# Altium footprint library Maxwell_LIB.PcbLib: 143 footprints (part 6 of 9)
Each footprint in its own frame and in the unit in brackets; x right, y up, seen from the top. Pads: shape width x height; smd on the part's side, far side on the other; paste and mask are expansions set on the pad; w line width, h text height; cw(c..) or ccw(c..) is an arc to the next point about the centre after c.
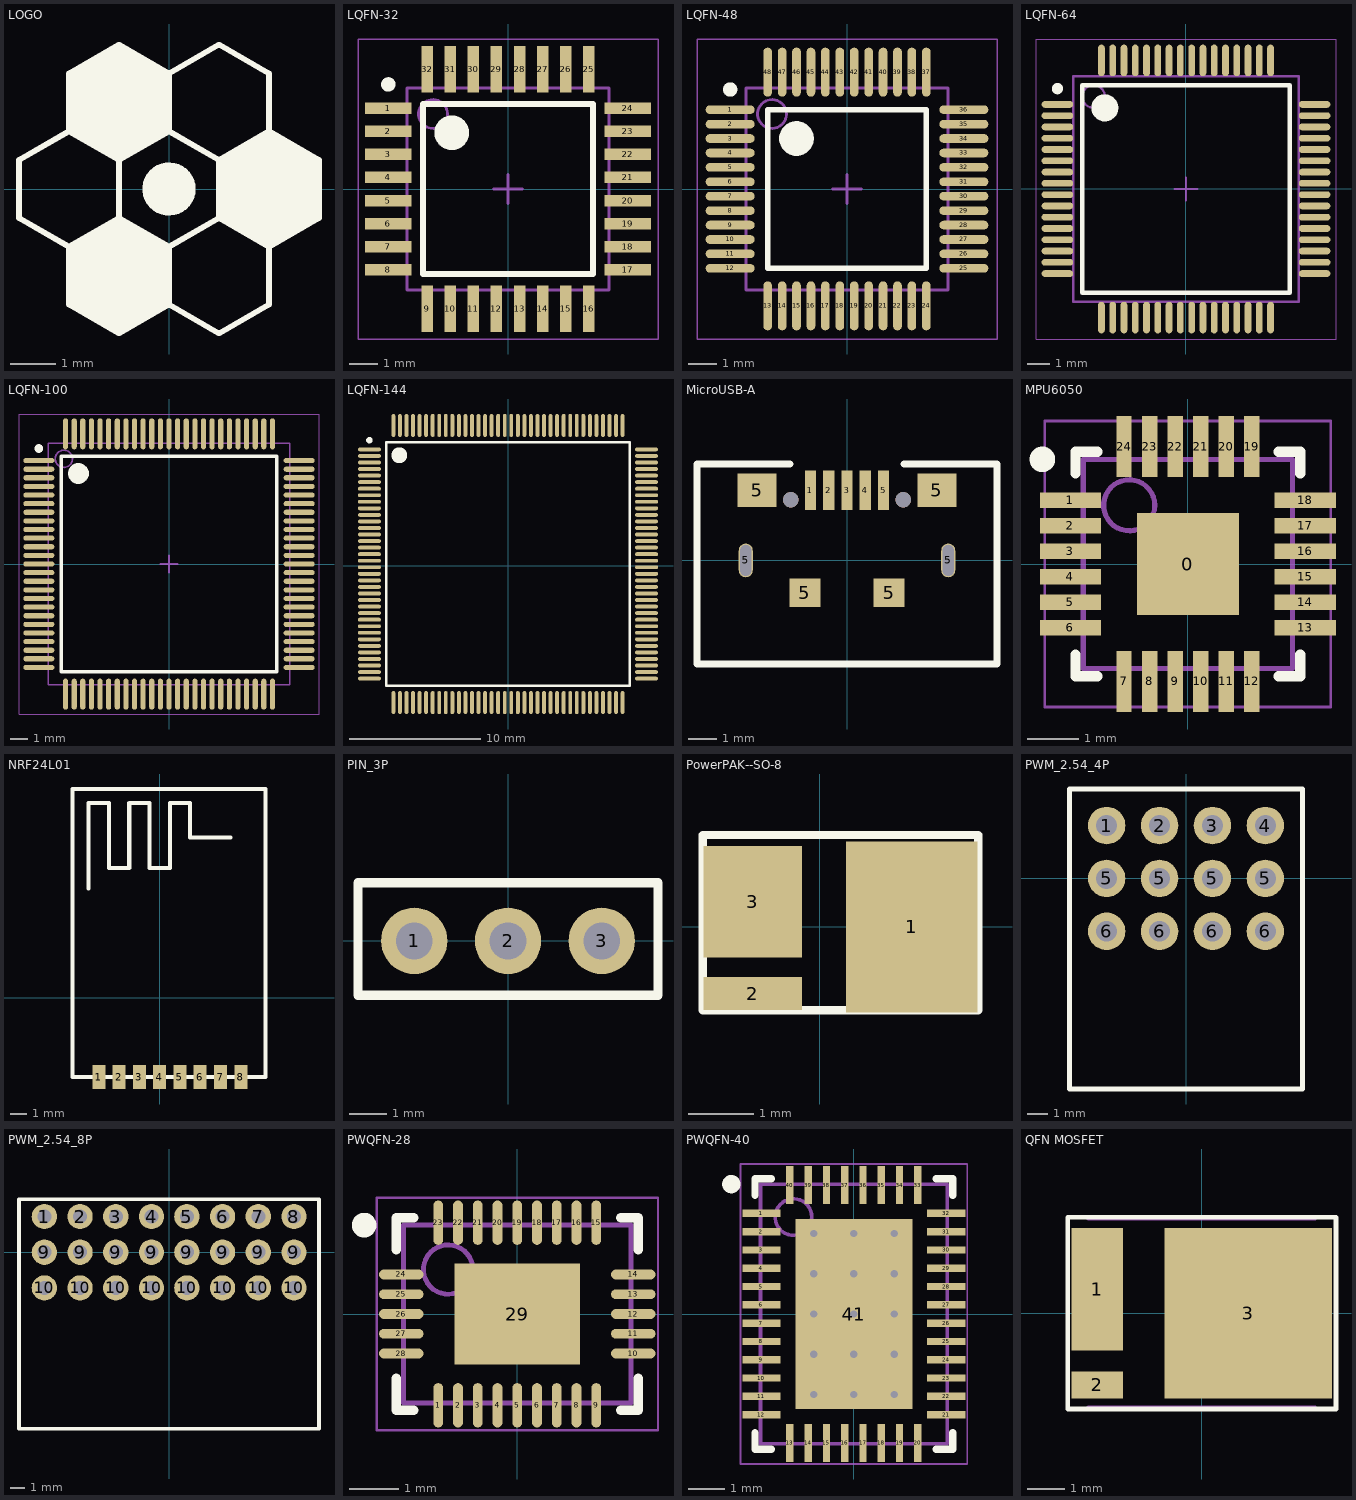
[diagram p5: the footprints below, top view; thin cyan lines are the x and y axes]

## LOGO [mm]
Top Overlay:
  circle w0.127: c0,0 r0.524
  region: 0,-0.524 -0.104,-0.524 -0.297,-0.444 -0.444,-0.297 -0.524,-0.104 -0.524,0 -0.524,0.104 -0.444,0.297 -0.297,0.444 -0.104,0.524 0,0.524 0.104,0.524 0.297,0.444 0.444,0.297 0.524,0.104 0.524,0 0.524,-0.104 0.444,-0.297 0.297,-0.444 0.104,-0.524
  region: -2.2,-2.54 -1.1,-3.175 0,-2.54 0,-1.27 -1.1,-0.635 -2.2,-1.27
  region: 1.1,-0.635 2.2,-1.27 3.3,-0.635 3.3,0.635 2.2,1.27 1.1,0.635
  region: -2.2,1.27 -1.1,0.635 0,1.27 0,2.54 -1.1,3.175 -2.2,2.54
  lines w0.127: -2.2,-1.27 -1.1,-0.635 ; -2.2,-1.27 -3.3,-0.635 -3.3,0.635 -2.2,1.27 ; -2.2,-1.27 -2.2,-2.54 -1.1,-3.175 0,-2.54 ; -2.2,1.27 -1.1,0.635 ; -2.2,1.27 -2.2,2.54 -1.1,3.175 0,2.54 ; -1.1,-0.635 -1.1,0.635 ; -1.1,-0.635 0,-1.27 ; -1.1,0.635 0,1.27 ; 0,-2.54 0,-1.27 ; 0,-2.54 1.1,-3.175 2.2,-2.54 2.2,-1.27 ; 0,-1.27 1.1,-0.635 ; 0,1.27 0,2.54 ; 0,1.27 1.1,0.635 ; 0,1.27 1.1,0.635 ; 0,2.54 1.1,3.175 2.2,2.54 2.2,1.27 ; 1.1,-0.635 2.2,-1.27 ; 1.1,-0.635 1.1,0.635 ; 1.1,0.635 2.2,1.27 ; 2.2,-1.27 3.3,-0.635 3.3,0.635 2.2,1.27
Bottom Overlay:
  circle w0.127: c0,0 r0.508
  region: 0,-0.508 -0.101,-0.508 -0.288,-0.431 -0.431,-0.288 -0.508,-0.101 -0.508,0 -0.508,0.101 -0.431,0.288 -0.288,0.431 -0.101,0.508 0,0.508 0.101,0.508 0.288,0.431 0.431,0.288 0.508,0.101 0.508,0 0.508,-0.101 0.431,-0.288 0.288,-0.431 0.101,-0.508
  region: 0,-2.54 1.1,-3.175 2.2,-2.54 2.2,-1.27 1.1,-0.635 0,-1.27
  region: -3.3,-0.635 -2.2,-1.27 -1.1,-0.635 -1.1,0.635 -2.2,1.27 -3.3,0.635
  region: 0,1.27 1.1,0.635 2.2,1.27 2.2,2.54 1.1,3.175 0,2.54
  lines w0.127: -2.2,-1.27 -1.1,-0.635 ; -2.2,-1.27 -3.3,-0.635 -3.3,0.635 -2.2,1.27 ; -2.2,-1.27 -2.2,-2.54 -1.1,-3.175 0,-2.54 ; -2.2,1.27 -1.1,0.635 ; -2.2,1.27 -2.2,2.54 -1.1,3.175 0,2.54 ; -1.1,-0.635 -1.1,0.635 ; -1.1,-0.635 0,-1.27 ; -1.1,0.635 0,1.27 ; 0,-2.54 0,-1.27 ; 0,-2.54 1.1,-3.175 2.2,-2.54 2.2,-1.27 ; 0,-1.27 1.1,-0.635 ; 0,1.27 0,2.54 ; 0,1.27 1.1,0.635 ; 0,2.54 1.1,3.175 2.2,2.54 2.2,1.27 ; 1.1,-0.635 2.2,-1.27 ; 1.1,-0.635 1.1,0.635 ; 1.1,0.635 2.2,1.27 ; 2.2,-1.27 3.3,-0.635 3.3,0.635 2.2,1.27

## LQFN-32 [mm] "TQFP, 32-Leads, Body 7.00x7.00mm, Pitch 0.80mm, IPC Medium Density"
height 1.45
pads (32):
  rect 1.6x0.4 smd: 1(-4.15,2.8) 2(-4.15,2) 3(-4.15,1.2) 4(-4.15,0.4) 5(-4.15,-0.4) 6(-4.15,-1.2) 7(-4.15,-2) 8(-4.15,-2.8) 17(4.15,-2.8) 18(4.15,-2) 19(4.15,-1.2) 20(4.15,-0.4) 21(4.15,0.4) 22(4.15,1.2) 23(4.15,2) 24(4.15,2.8)
  rect 0.4x1.6 smd: 9(-2.8,-4.15) 10(-2,-4.15) 11(-1.2,-4.15) 12(-0.4,-4.15) 13(0.4,-4.15) 14(1.2,-4.15) 15(2,-4.15) 16(2.8,-4.15) 25(2.8,4.15) 26(2,4.15) 27(1.2,4.15) 28(0.4,4.15) 29(-0.4,4.15) 30(-1.2,4.15) 31(-2,4.15) 32(-2.8,4.15)
Top Overlay:
  circle w0.6: c-1.95,1.95 r0.3
  circle w0.25: c-4.15,3.625 r0.125
  lines w0.2: -2.95,-2.95 2.95,-2.95 2.95,2.95 -2.95,2.95 -2.95,-2.95
Mechanical 13:
  circle w0.1: c-2.6,2.6 r0.5
  lines w0.1: -3.5,-3.5 3.5,-3.5 3.5,3.5 -3.5,3.5 -3.5,-3.5
Mechanical 15:
  lines w0.05: -5.2,-5.2 5.2,-5.2 5.2,5.2 -5.2,5.2 -5.2,-5.2
  lines w0.1: -0.5,0 0.5,0 ; 0,-0.5 0,0.5
3D body "LQFP-32.STEP": height 1.62, standoff -0.01, extent -4.546,-4.546 4.597,4.597

## LQFN-48 [mm]
pads (48):
  oval 1.7x0.3 smd: 1(-4.05,2.75) 2(-4.05,2.25) 3(-4.05,1.75) 4(-4.05,1.25) 5(-4.05,0.75) 6(-4.05,0.25) 7(-4.05,-0.25) 8(-4.05,-0.75) 9(-4.05,-1.25) 10(-4.05,-1.75) 11(-4.05,-2.25) 12(-4.05,-2.75) 25(4.05,-2.75) 26(4.05,-2.25) 27(4.05,-1.75) 28(4.05,-1.25) 29(4.05,-0.75) 30(4.05,-0.25) 31(4.05,0.25) 32(4.05,0.75) 33(4.05,1.25) 34(4.05,1.75) 35(4.05,2.25) 36(4.05,2.75)
  oval 0.3x1.7 smd: 13(-2.75,-4.05) 14(-2.25,-4.05) 15(-1.75,-4.05) 16(-1.25,-4.05) 17(-0.75,-4.05) 18(-0.25,-4.05) 19(0.25,-4.05) 20(0.75,-4.05) 21(1.25,-4.05) 22(1.75,-4.05) 23(2.25,-4.05) 24(2.75,-4.05) 37(2.75,4.05) 38(2.25,4.05) 39(1.75,4.05) 40(1.25,4.05) 41(0.75,4.05) 42(0.25,4.05) 43(-0.25,4.05) 44(-0.75,4.05) 45(-1.25,4.05) 46(-1.75,4.05) 47(-2.25,4.05) 48(-2.75,4.05)
Top Overlay:
  circle w0.25: c-4.05,3.45 r0.125
  circle w0.6: c-1.75,1.75 r0.3
  lines w0.2: -2.75,-2.75 -2.75,2.75 2.75,2.75 2.75,-2.75 -2.75,-2.75
Mechanical 13:
  circle w0.1: c-2.6,2.6 r0.5
  lines w0.1: -3.5,-3.5 -3.5,3.5 3.5,3.5 3.5,-3.5 -3.5,-3.5
Mechanical 15:
  lines w0.05: -5.2,-5.2 -5.2,5.2 5.2,5.2 5.2,-5.2 -5.2,-5.2
  lines w0.1: -0.5,0 0.5,0 ; 0,-0.5 0,0.5
3D body "User Library-LQFP50P900X900X160.STEP": height 1.6, standoff 0, extent -4.5,-4.576 4.5,4.424

## LQFN-64 [mm] "SQFP, 64-Leads, Body 10.00x10.00mm, Pitch 0.50mm, IPC Medium Density"
height 2.45
pads (64):
  oval 1.4x0.3 smd: 1(-5.7,3.75) 2(-5.7,3.25) 3(-5.7,2.75) 4(-5.7,2.25) 5(-5.7,1.75) 6(-5.7,1.25) 7(-5.7,0.75) 8(-5.7,0.25) 9(-5.7,-0.25) 10(-5.7,-0.75) 11(-5.7,-1.25) 12(-5.7,-1.75) 13(-5.7,-2.25) 14(-5.7,-2.75) 15(-5.7,-3.25) 16(-5.7,-3.75) 33(5.7,-3.75) 34(5.7,-3.25) 35(5.7,-2.75) 36(5.7,-2.25) 37(5.7,-1.75) 38(5.7,-1.25) 39(5.7,-0.75) 40(5.7,-0.25) 41(5.7,0.25) 42(5.7,0.75) 43(5.7,1.25) 44(5.7,1.75) 45(5.7,2.25) 46(5.7,2.75) 47(5.7,3.25) 48(5.7,3.75)
  oval 0.3x1.4 smd: 17(-3.75,-5.7) 18(-3.25,-5.7) 19(-2.75,-5.7) 20(-2.25,-5.7) 21(-1.75,-5.7) 22(-1.25,-5.7) 23(-0.75,-5.7) 24(-0.25,-5.7) 25(0.25,-5.7) 26(0.75,-5.7) 27(1.25,-5.7) 28(1.75,-5.7) 29(2.25,-5.7) 30(2.75,-5.7) 31(3.25,-5.7) 32(3.75,-5.7) 49(3.75,5.7) 50(3.25,5.7) 51(2.75,5.7) 52(2.25,5.7) 53(1.75,5.7) 54(1.25,5.7) 55(0.75,5.7) 56(0.25,5.7) 57(-0.25,5.7) 58(-0.75,5.7) 59(-1.25,5.7) 60(-1.75,5.7) 61(-2.25,5.7) 62(-2.75,5.7) 63(-3.25,5.7) 64(-3.75,5.7)
Top Overlay:
  circle w0.25: c-5.7,4.45 r0.125
  circle w0.6: c-3.6,3.6 r0.3
  lines w0.2: -4.6,-4.6 -4.6,4.6 4.6,4.6 4.6,-4.6 -4.6,-4.6
Mechanical 13:
  circle w0.1: c-4.1,4.1 r0.5
  lines w0.1: -5,-5 -5,5 5,5 5,-5 -5,-5
Mechanical 15:
  lines w0.05: -6.65,-6.65 -6.65,6.65 6.65,6.65 6.65,-6.65 -6.65,-6.65
  lines w0.1: -0.5,0 0.5,0 ; 0,-0.5 0,0.5
3D body "LQFP64.STEP": height 1.6, standoff 0.01, extent -5.974,-5.999 6.024,5.999

## LQFN-100 [mm]
pads (100):
  oval 1.8x0.3 smd: 1(-7.55,6) 2(-7.55,5.5) 3(-7.55,5) 4(-7.55,4.5) 5(-7.55,4) 6(-7.55,3.5) 7(-7.55,3) 8(-7.55,2.5) 9(-7.55,2) 10(-7.55,1.5) 11(-7.55,1) 12(-7.55,0.5) 13(-7.55,0) 14(-7.55,-0.5) 15(-7.55,-1) 16(-7.55,-1.5) 17(-7.55,-2) 18(-7.55,-2.5) 19(-7.55,-3) 20(-7.55,-3.5) 21(-7.55,-4) 22(-7.55,-4.5) 23(-7.55,-5) 24(-7.55,-5.5) 25(-7.55,-6) 51(7.55,-6) 52(7.55,-5.5) 53(7.55,-5) 54(7.55,-4.5) 55(7.55,-4) 56(7.55,-3.5) 57(7.55,-3) 58(7.55,-2.5) 59(7.55,-2) 60(7.55,-1.5) 61(7.55,-1) 62(7.55,-0.5) 63(7.55,0) 64(7.55,0.5) 65(7.55,1) 66(7.55,1.5) 67(7.55,2) 68(7.55,2.5) 69(7.55,3) 70(7.55,3.5) 71(7.55,4) 72(7.55,4.5) 73(7.55,5) 74(7.55,5.5) 75(7.55,6)
  oval 0.3x1.8 smd: 26(-6,-7.55) 27(-5.5,-7.55) 28(-5,-7.55) 29(-4.5,-7.55) 30(-4,-7.55) 31(-3.5,-7.55) 32(-3,-7.55) 33(-2.5,-7.55) 34(-2,-7.55) 35(-1.5,-7.55) 36(-1,-7.55) 37(-0.5,-7.55) 38(0,-7.55) 39(0.5,-7.55) 40(1,-7.55) 41(1.5,-7.55) 42(2,-7.55) 43(2.5,-7.55) 44(3,-7.55) 45(3.5,-7.55) 46(4,-7.55) 47(4.5,-7.55) 48(5,-7.55) 49(5.5,-7.55) 50(6,-7.55) 76(6,7.55) 77(5.5,7.55) 78(5,7.55) 79(4.5,7.55) 80(4,7.55) 81(3.5,7.55) 82(3,7.55) 83(2.5,7.55) 84(2,7.55) 85(1.5,7.55) 86(1,7.55) 87(0.5,7.55) 88(0,7.55) 89(-0.5,7.55) 90(-1,7.55) 91(-1.5,7.55) 92(-2,7.55) 93(-2.5,7.55) 94(-3,7.55) 95(-3.5,7.55) 96(-4,7.55) 97(-4.5,7.55) 98(-5,7.55) 99(-5.5,7.55) 100(-6,7.55)
Top Overlay:
  circle w0.25: c-7.55,6.7 r0.125
  circle w0.6: c-5.25,5.25 r0.3
  lines w0.2: -6.25,-6.25 -6.25,6.25 6.25,6.25 6.25,-6.25 -6.25,-6.25
Mechanical 13:
  circle w0.1: c-6.1,6.1 r0.5
  lines w0.1: -7,-7 -7,7 7,7 7,-7 -7,-7
Mechanical 15:
  lines w0.05: -8.7,-8.7 -8.7,8.7 8.7,8.7 8.7,-8.7 -8.7,-8.7
  lines w0.1: -0.5,0 0.5,0 ; 0,-0.5 0,0.5
3D body "LQFP-100.STEP": height 1.5, standoff 0, extent -8,-8 8,8

## LQFN-144 [mm]
pads (144):
  oval 1.75x0.297 smd: 1(-10.575,8.877) 2(-10.575,8.377) 3(-10.575,7.877) 4(-10.575,7.377) 5(-10.575,6.877) 6(-10.575,6.377) 7(-10.575,5.877) 8(-10.575,5.377) 9(-10.575,4.877) 10(-10.575,4.377) 11(-10.575,3.877) 12(-10.575,3.377) 13(-10.575,2.877) 14(-10.575,2.377) 15(-10.575,1.877) 16(-10.575,1.377) 17(-10.575,0.877) 18(-10.575,0.377) 19(-10.575,-0.123) 20(-10.575,-0.623) 21(-10.575,-1.123) 22(-10.575,-1.623) 23(-10.575,-2.123) 24(-10.575,-2.623) 25(-10.575,-3.123) 26(-10.575,-3.623) 27(-10.575,-4.123) 28(-10.575,-4.623) 29(-10.575,-5.123) 30(-10.575,-5.623) 31(-10.575,-6.123) 32(-10.575,-6.623) 33(-10.575,-7.123) 34(-10.575,-7.623) 35(-10.575,-8.123) 36(-10.575,-8.623) 73(10.575,-8.623) 74(10.575,-8.123) 75(10.575,-7.623) 76(10.575,-7.123) 77(10.575,-6.623) 78(10.575,-6.123) 79(10.575,-5.623) 80(10.575,-5.123) 81(10.575,-4.623) 82(10.575,-4.123) 83(10.575,-3.623) 84(10.575,-3.123) 85(10.575,-2.623) 86(10.575,-2.123) 87(10.575,-1.623) 88(10.575,-1.123) 89(10.575,-0.623) 90(10.575,-0.123) 91(10.575,0.377) 92(10.575,0.877) 93(10.575,1.377) 94(10.575,1.877) 95(10.575,2.377) 96(10.575,2.877) 97(10.575,3.377) 98(10.575,3.877) 99(10.575,4.377) 100(10.575,4.877) 101(10.575,5.377) 102(10.575,5.877) 103(10.575,6.377) 104(10.575,6.877) 105(10.575,7.377) 106(10.575,7.877) 107(10.575,8.377) 108(10.575,8.877)
  oval 0.297x1.75 smd: 37(-8.75,-10.448) 38(-8.25,-10.448) 39(-7.75,-10.448) 40(-7.25,-10.448) 41(-6.75,-10.448) 42(-6.25,-10.448) 43(-5.75,-10.448) 44(-5.25,-10.448) 45(-4.75,-10.448) 46(-4.25,-10.448) 47(-3.75,-10.448) 48(-3.25,-10.448) 49(-2.75,-10.448) 50(-2.25,-10.448) 51(-1.75,-10.448) 52(-1.25,-10.448) 53(-0.75,-10.448) 54(-0.25,-10.448) 55(0.25,-10.448) 56(0.75,-10.448) 57(1.25,-10.448) 58(1.75,-10.448) 59(2.25,-10.448) 60(2.75,-10.448) 61(3.25,-10.448) 62(3.75,-10.448) 63(4.25,-10.448) 64(4.75,-10.448) 65(5.25,-10.448) 66(5.75,-10.448) 67(6.25,-10.448) 68(6.75,-10.448) 69(7.25,-10.448) 70(7.75,-10.448) 71(8.25,-10.448) 72(8.75,-10.448) 109(8.75,10.702) 110(8.25,10.702) 111(7.75,10.702) 112(7.25,10.702) 113(6.75,10.702) 114(6.25,10.702) 115(5.75,10.702) 116(5.25,10.702) 117(4.75,10.702) 118(4.25,10.702) 119(3.75,10.702) 120(3.25,10.702) 121(2.75,10.702) 122(2.25,10.702) 123(1.75,10.702) 124(1.25,10.702) 125(0.75,10.702) 126(0.25,10.702) 127(-0.25,10.702) 128(-0.75,10.702) 129(-1.25,10.702) 130(-1.75,10.702) 131(-2.25,10.702) 132(-2.75,10.702) 133(-3.25,10.702) 134(-3.75,10.702) 135(-4.25,10.702) 136(-4.75,10.702) 137(-5.25,10.702) 138(-5.75,10.702) 139(-6.25,10.702) 140(-6.75,10.702) 141(-7.25,10.702) 142(-7.75,10.702) 143(-8.25,10.702) 144(-8.75,10.702)
Top Overlay:
  circle w0.25: c-10.575,9.577 r0.125
  circle w0.6: c-8.3,8.427 r0.3
  lines w0.2: -9.3,-9.173 -9.3,9.427 9.3,9.427 9.3,-9.173 -9.3,-9.173
3D body "LQFP144.STEP": height 2, standoff 0.1, extent -11.127,-10.772 10.873,11.228

## MicroUSB-A [mm]
pads (11):
  rect 0.4x1.4 smd: 1(-1.3,2.5) 2(-0.65,2.5) 3(0,2.5) 4(0.65,2.5) 5(1.3,2.5)
  oval 0.5x1.2 hole 0.4 slot 1.1 at 90 deg: 5(-3.6,0) 5(3.6,0)
  rect 1.4x1.2 smd: 5(-3.2,2.5) 5(3.2,2.5)
  rect 1.1x1 smd: 5(-1.5,-1.15) 5(1.5,-1.15)
via 2,2.15 diameter 0.55 hole 0.55
via -2,2.15 diameter 0.55 hole 0.55
Top Overlay:
  lines w0.254: -2.032,3.429 -5.334,3.429 -5.334,-3.683 5.334,-3.683 5.334,3.429 2.032,3.429
3D body "User Library-10103594.STEP": height 2.65, standoff -0.95, extent -4.02,-2.498 4.02,3.535

## MPU6050 [mm]
pads (25):
  rect 2x2 smd: 0(0,0)
  rect 1.2x0.3 smd: 1(-2.3,1.25) 2(-2.3,0.75) 3(-2.3,0.25) 4(-2.3,-0.25) 5(-2.3,-0.75) 6(-2.3,-1.25) 13(2.3,-1.25) 14(2.3,-0.75) 15(2.3,-0.25) 16(2.3,0.25) 17(2.3,0.75) 18(2.3,1.25)
  rect 0.3x1.2 smd: 7(-1.25,-2.3) 8(-0.75,-2.3) 9(-0.25,-2.3) 10(0.25,-2.3) 11(0.75,-2.3) 12(1.25,-2.3) 19(1.25,2.3) 20(0.75,2.3) 21(0.25,2.3) 22(-0.25,2.3) 23(-0.75,2.3) 24(-1.25,2.3)
Top Overlay:
  circle w0.25: c-2.85,2.05 r0.125
  lines w0.2: -2.2,-1.775 -2.2,-2.2 -1.775,-2.2 ; -2.2,1.775 -2.2,2.2 -1.775,2.2 ; 1.775,-2.2 2.2,-2.2 2.2,-1.775 ; 1.775,2.2 2.2,2.2 2.2,1.775
Mechanical 13:
  circle w0.1: c-1.15,1.15 r0.5
  lines w0.1: -2.05,-2.05 2.05,-2.05 2.05,2.05 -2.05,2.05 -2.05,-2.05
Mechanical 15:
  lines w0.05: -2.8,-2.8 2.8,-2.8 2.8,2.8 -2.8,2.8 -2.8,-2.8
  lines w0.1: -0.5,0 0.5,0 ; 0,-0.5 0,0.5
3D body "User Library-mpu-6050_qfn-24-1.STEP": height 0.88, standoff -0.02, extent -2.008,-1.995 2.032,2.045

## NRF24L01 [mm]
pads (8):
  rect 0.813x1.5 smd: 1(-3.81,-4.953) 2(-2.54,-4.953) 3(-1.27,-4.953) 4(0,-4.953) 5(1.27,-4.953) 6(2.54,-4.953) 7(3.81,-4.953) 8(5.08,-4.953)
Top Overlay:
  lines w0.254: -4.445,6.858 -4.445,12.192 -3.175,12.192 -3.175,8.128 -1.905,8.128 -1.905,12.192 -0.635,12.192 -0.635,8.128 0.635,8.128 0.635,12.192 1.905,12.192 1.905,10.033 4.445,10.033 ; -5.461,-4.953 -5.461,13.081 6.629,13.081 6.629,-4.953 -5.461,-4.953
3D body "nRF24L01-Mini.STEP": height 0.8, standoff 0, extent -5.472,-5.038 6.528,12.962

## PIN_3P [mm]
pads (3):
  round 1.8 hole 1: 1(-2.54,0) 2(0,0) 3(2.54,0)
Top Overlay:
  lines w0.254: -4.064,-1.473 -4.064,1.575 4.064,1.575 4.064,-1.473 -4.064,-1.473
3D body "Header3P.stp": height 8.77, standoff -2.77, extent -3.81,-1.27 3.81,1.27

## PowerPAK--SO-8 [mm]
pads (3):
  rect 2x2.6 smd: 1(1.397,0)
  rect 1.5x0.5 smd: 2(-1.016,-1.016)
  rect 1.5x1.7 smd: 3(-1.016,0.381)
Top Overlay:
  lines w0.127: -1.778,-1.27 -1.778,1.397 2.413,1.397 2.413,-1.27 -1.778,-1.27
3D body "POWERPAK.STEP": height 0, standoff -1.04, extent -1.523,-1.65 1.777,1.65

## PWM_2.54_4P [mm]
pads (12):
  round 1.8 hole 1: 1(-3.81,2.54) 2(-1.27,2.54) 3(1.27,2.54) 4(3.81,2.54) 5(-3.81,0) 5(-1.27,0) 5(1.27,0) 5(3.81,0) 6(-3.81,-2.54) 6(-1.27,-2.54) 6(1.27,-2.54) 6(3.81,-2.54)
Top Overlay:
  lines w0.254: -5.588,-10.109 5.588,-10.109 5.588,4.293 -5.588,4.293 -5.588,-10.109
3D body "Pin3Row_4p.stp": height 7.64, standoff -3, extent -5.08,-12.603 5.08,2.997

## PWM_2.54_8P [mm]
pads (24):
  round 1.8 hole 1: 1(-8.865,2.54) 2(-6.325,2.54) 3(-3.785,2.54) 4(-1.245,2.54) 5(1.27,2.54) 6(3.81,2.54) 7(6.35,2.54) 8(8.89,2.54) 9(-8.865,0) 9(-6.325,0) 9(-3.785,0) 9(-1.245,0) 9(1.27,0) 9(3.81,0) 9(6.35,0) 9(8.89,0) 10(-8.865,-2.54) 10(-6.325,-2.54) 10(-3.785,-2.54) 10(-1.245,-2.54) 10(1.27,-2.54) 10(3.81,-2.54) 10(6.35,-2.54) 10(8.89,-2.54)
Top Overlay:
  lines w0.254: -10.668,-12.548 -10.668,3.759 10.668,3.759 10.668,-12.548 -10.668,-12.548
3D body "Pin3Row_4p.stp": height 7.64, standoff -3, extent 0.025,-12.654 10.185,2.946
3D body "Pin3Row_4p.stp": height 7.64, standoff -3, extent -10.134,-12.641 0.026,2.959

## PWQFN-28 [mm] "QFN, 28-Leads, Body 4.50x3.50mm, Pitch 0.40mm, Thermal Pad 2.55x2.05mm, IPC Medium Density"
height 0.8
pads (29):
  oval 0.2x0.9 smd: 1(-1.6,-1.85) 2(-1.2,-1.85) 3(-0.8,-1.85) 4(-0.4,-1.85) 5(0,-1.85) 6(0.4,-1.85) 7(0.8,-1.85) 8(1.2,-1.85) 9(1.6,-1.85) 15(1.6,1.85) 16(1.2,1.85) 17(0.8,1.85) 18(0.4,1.85) 19(0,1.85) 20(-0.4,1.85) 21(-0.8,1.85) 22(-1.2,1.85) 23(-1.6,1.85)
  oval 0.9x0.2 smd: 10(2.35,-0.8) 11(2.35,-0.4) 12(2.35,0) 13(2.35,0.4) 14(2.35,0.8) 24(-2.35,0.8) 25(-2.35,0.4) 26(-2.35,0) 27(-2.35,-0.4) 28(-2.35,-0.8)
  rect 2.55x2.05 smd: 29(0,0)
Top Overlay:
  circle w0.25: c-3.1,1.8 r0.125
  lines w0.2: -2.45,-1.3 -2.45,-1.95 -2.1,-1.95 ; -2.45,1.3 -2.45,1.95 -2.1,1.95 ; 2.1,-1.95 2.45,-1.95 2.45,-1.3 ; 2.1,1.95 2.45,1.95 2.45,1.3
Mechanical 13:
  circle w0.1: c-1.4,0.9 r0.5
  lines w0.1: -2.3,-1.8 -2.3,1.8 2.3,1.8 2.3,-1.8 -2.3,-1.8
Mechanical 15:
  lines w0.05: -2.85,-2.35 -2.85,2.35 2.85,2.35 2.85,-2.35 -2.85,-2.35
  lines w0.1: -0.5,0 0.5,0 ; 0,-0.5 0,0.5
3D body "User Library-20-VQFN (3_5x4_5).STEP": height 0.85, standoff -0.05, extent -2.26,-1.76 2.26,1.76

## PWQFN-40 [mm] "QFN, 40-Leads, Body 5.00x7.00mm, Pitch 0.50mm, Thermal Pad 3.20x5.20mm, IPC Medium Density"
height 0.8
pads (41):
  rect 1.05x0.2 smd: 1(-2.525,2.75) 2(-2.525,2.25) 3(-2.525,1.75) 4(-2.525,1.25) 5(-2.525,0.75) 6(-2.525,0.25) 7(-2.525,-0.25) 8(-2.525,-0.75) 9(-2.525,-1.25) 10(-2.525,-1.75) 11(-2.525,-2.25) 12(-2.525,-2.75) 21(2.525,-2.75) 22(2.525,-2.25) 23(2.525,-1.75) 24(2.525,-1.25) 25(2.525,-0.75) 26(2.525,-0.25) 27(2.525,0.25) 28(2.525,0.75) 29(2.525,1.25) 30(2.525,1.75) 31(2.525,2.25) 32(2.525,2.75)
  rect 0.2x1.05 smd: 13(-1.75,-3.525) 14(-1.25,-3.525) 15(-0.75,-3.525) 16(-0.25,-3.525) 17(0.25,-3.525) 18(0.75,-3.525) 19(1.25,-3.525) 20(1.75,-3.525) 33(1.75,3.525) 34(1.25,3.525) 35(0.75,3.525) 36(0.25,3.525) 37(-0.25,3.525) 38(-0.75,3.525) 39(-1.25,3.525) 40(-1.75,3.525)
  rect 3.2x5.2 smd: 41(0,0)
via -1.1,2.2 diameter 0.5 hole 0.2
via 0,2.2 diameter 0.5 hole 0.2
via 1.1,2.2 diameter 0.5 hole 0.2
via -1.1,1.1 diameter 0.5 hole 0.2
via 0,1.1 diameter 0.5 hole 0.2
via 1.1,1.1 diameter 0.5 hole 0.2
via -1.1,0 diameter 0.5 hole 0.2
via 0,0 diameter 0.5 hole 0.2
via 1.1,0 diameter 0.5 hole 0.2
via -1.1,-1.1 diameter 0.5 hole 0.2
via 0,-1.1 diameter 0.5 hole 0.2
via 1.1,-1.1 diameter 0.5 hole 0.2
via -1.1,-2.2 diameter 0.5 hole 0.2
via 0,-2.2 diameter 0.5 hole 0.2
via 1.1,-2.2 diameter 0.5 hole 0.2
Top Overlay:
  circle w0.25: c-3.35,3.55 r0.125
  lines w0.2: -2.7,-3.25 -2.7,-3.7 -2.25,-3.7 ; -2.7,3.25 -2.7,3.7 -2.25,3.7 ; 2.25,-3.7 2.7,-3.7 2.7,-3.25 ; 2.25,3.7 2.7,3.7 2.7,3.25
Mechanical 13:
  circle w0.1: c-1.65,2.65 r0.5
  lines w0.1: -2.55,-3.55 -2.55,3.55 2.55,3.55 2.55,-3.55 -2.55,-3.55
Mechanical 15:
  lines w0.05: -3.1,-4.1 -3.1,4.1 3.1,4.1 3.1,-4.1 -3.1,-4.1
  lines w0.1: -0.5,0 0.5,0 ; 0,-0.5 0,0.5
3D body: height 0.8, standoff 0.01, extent -2.55,-3.55 2.55,3.55

## QFN MOSFET [mm]
pads (3):
  rect 1.372x3.25 smd: 1(-2.77,0.635)
  rect 1.372x0.71 smd: 2(-2.77,-1.905)
  rect 4.44x4.52 smd: 3(1.236,0)
Top Overlay:
  lines w0.127: -3.556,-2.54 -3.556,2.54 3.556,2.54 3.556,-2.54 -3.556,-2.54
Mechanical 1:
  lines w0.1: -3,-2.5 3,-2.5 ; -3,2.5 3,2.5
3D body: height 1, standoff 0, extent -3,-2.5 3,2.5